# Altium footprint library THU VIEN PCB.PCBLib: 911 footprints (part 34 of 57)
Each footprint in its own frame and in the unit in brackets; x right, y up, seen from the top. Pads: shape width x height; smd on the part's side, far side on the other; paste and mask are expansions set on the pad; w line width, h text height; cw(c..) or ccw(c..) is an arc to the next point about the centre after c.
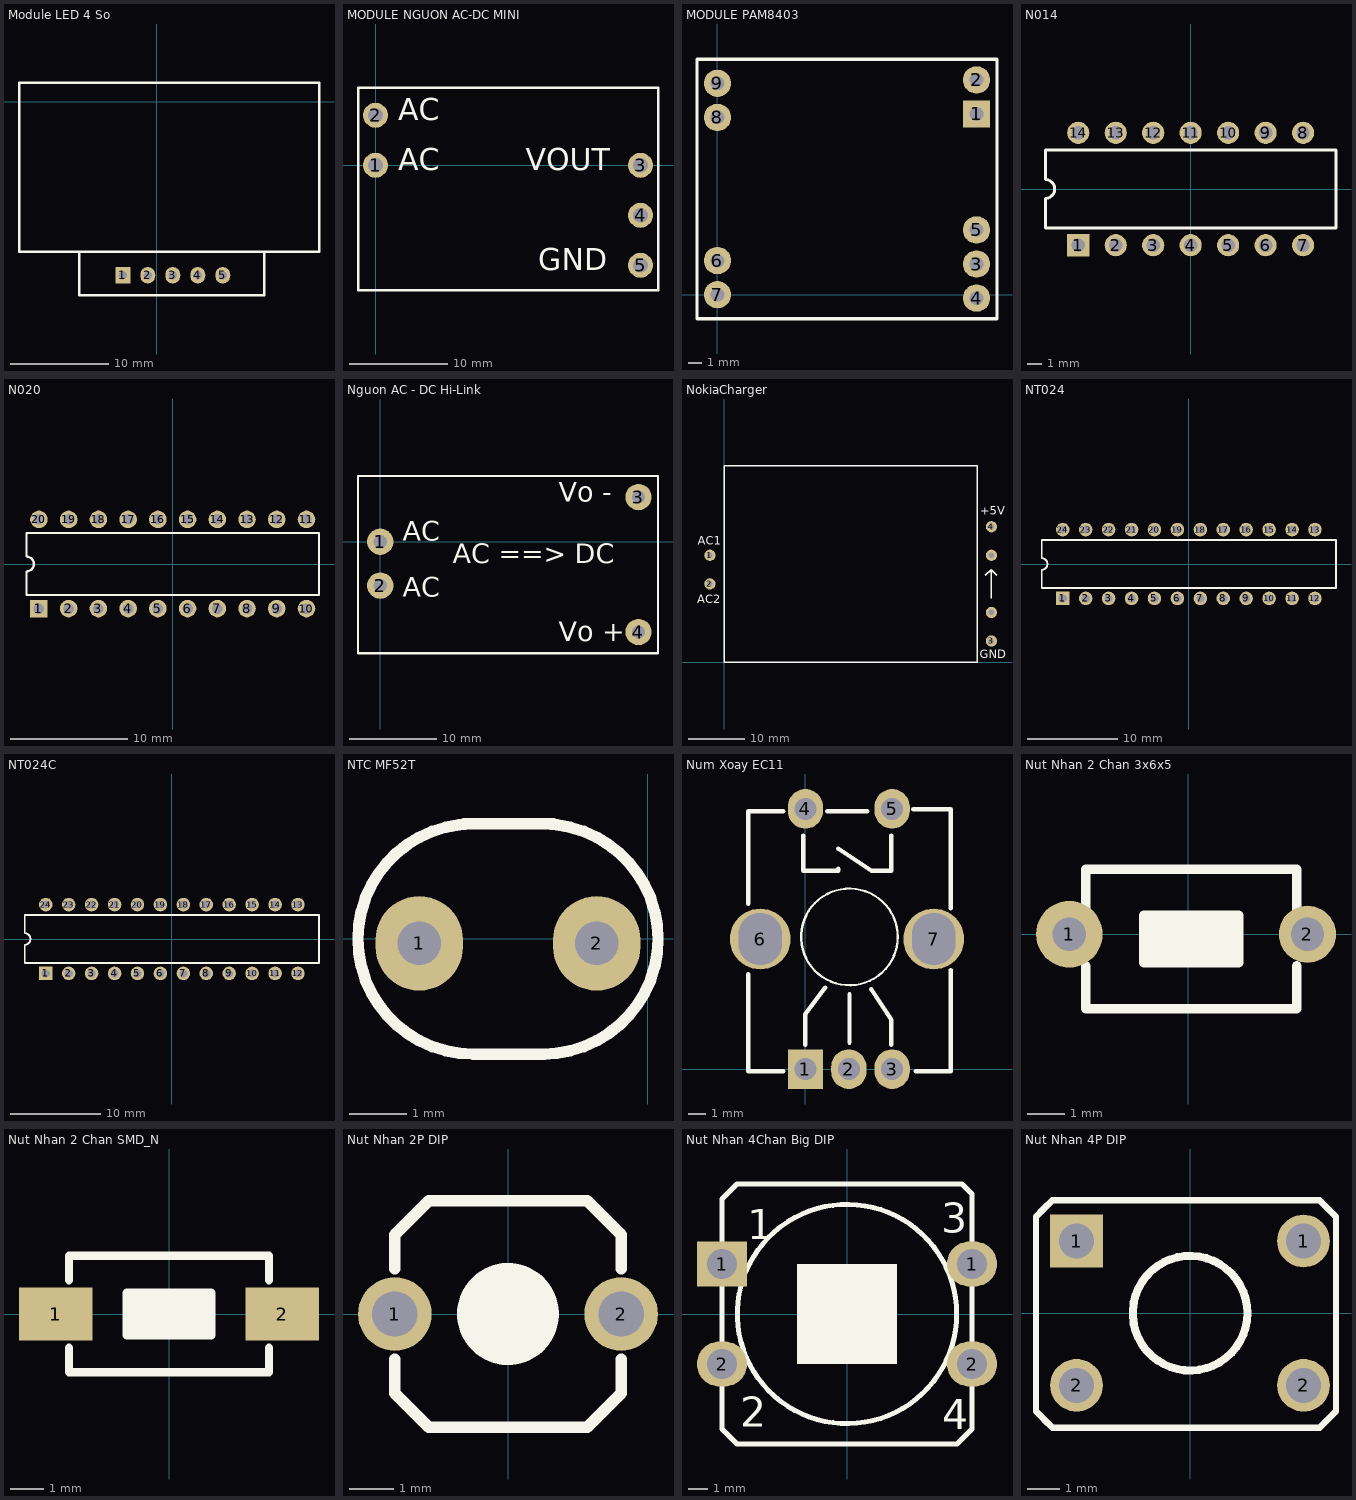
[diagram p33: the footprints below, top view; thin cyan lines are the x and y axes]

## Module LED 4 So [mil]
pads (5):
  rect 60x65 hole 35.43: 1(-135,-695)
  oval 60x65 hole 35.43: 2(-35,-695) 3(65,-695) 4(165,-695) 5(265,-695)
Top Overlay:
  lines w10: -310,-600 -310,-775 430,-775 430,-600 ; -550,-600 -550,75 650,75 650,-600 -550,-600
3D body "MH.stp": height 348.43, standoff 92.52, extent -559.67,-778.68 641.12,87.47
3D body: height 275.59, standoff -39.37, extent -151,-711 -119.63,-679.57
3D body: height 275.59, standoff -39.37, extent -51,-711 -19.63,-679.57
3D body: height 275.59, standoff -39.37, extent 49,-711 80.37,-679.57
3D body: height 275.59, standoff -39.37, extent 149,-711 180.37,-679.57
3D body: height 275.59, standoff -39.37, extent 259,-711 290.37,-679.57

## MODULE NGUON AC-DC MINI [mm]
pads (5):
  round 2.54 hole 1.5: 1(0,0) 2(0,5.08) 3(26.924,0) 4(26.924,-5.08) 5(26.924,-10.16)
Top Overlay:
  lines w0.254: -1.778,-12.7 -1.778,7.874 28.702,7.874 28.702,-12.7 -1.778,-12.7
  text "AC" at 2.286,3.81 h3.81
  text "AC" at 2.286,-1.27 h3.81
  text "GND" at 16.51,-11.43 h3.81
  text "VOUT" at 15.24,-1.27 h3.81

## MODULE PAM8403 [mm]
pads (9):
  rect 2x2 hole 1: 1(19,13.246)
  round 2 hole 1: 2(19,15.746) 3(19,2.246) 4(19,-0.254) 5(19,4.746) 6(0,2.496) 7(0,-0.004) 8(0,12.996) 9(0,15.496)
Top Overlay:
  lines w0.254: -1.5,-1.754 20.5,-1.754 20.5,17.246 -1.5,17.246 -1.5,-1.754

## N014 [mm] "DIP; 14 Leads; Row Spacing 7.62 mm; Pitch 2.54 mm"
height 5.08
pads (14):
  rect 1.5x1.5 hole 0.9: 1(-7.62,-3.81)
  round 1.5 hole 0.9: 2(-5.08,-3.81) 3(-2.54,-3.81) 4(0,-3.81) 5(2.54,-3.81) 6(5.08,-3.81) 7(7.62,-3.81) 8(7.62,3.81) 9(5.08,3.81) 10(2.54,3.81) 11(0,3.81) 12(-2.54,3.81) 13(-5.08,3.81) 14(-7.62,3.81)
Top Overlay:
  lines w0.2: -9.85,-2.65 -9.85,-0.635 ccw(c-9.85,0) -9.85,0.635 -9.85,2.65 9.85,2.65 9.85,-2.65 -9.85,-2.65

## N020 [mm] "DIP; 20 Leads; Row Spacing 7.62 mm; Pitch 2.54 mm"
height 5.08
pads (20):
  rect 1.5x1.5 hole 0.9: 1(-11.43,-3.81)
  round 1.5 hole 0.9: 2(-8.89,-3.81) 3(-6.35,-3.81) 4(-3.81,-3.81) 5(-1.27,-3.81) 6(1.27,-3.81) 7(3.81,-3.81) 8(6.35,-3.81) 9(8.89,-3.81) 10(11.43,-3.81) 11(11.43,3.81) 12(8.89,3.81) 13(6.35,3.81) 14(3.81,3.81) 15(1.27,3.81) 16(-1.27,3.81) 17(-3.81,3.81) 18(-6.35,3.81) 19(-8.89,3.81) 20(-11.43,3.81)
Top Overlay:
  lines w0.2: -12.5,-2.65 -12.5,-0.635 ccw(c-12.5,0) -12.5,0.635 -12.5,2.65 12.5,2.65 12.5,-2.65 -12.5,-2.65

## Nguon AC - DC Hi-Link [mm]
pads (4):
  round 3 hole 1.5: 1(0,0) 2(0,-5) 3(29.4,5.08) 4(29.4,-10.287)
Top Overlay:
  lines w0.254: -2.54,-12.7 -2.54,7.493 31.623,7.493 31.623,-12.7 -2.54,-12.7
  text "Vo +" at 20.32,-12.065 h3.81
  text "Vo -" at 20.32,3.81 h3.81
  text "AC" at 2.54,-0.635 h3.81
  text "AC" at 2.54,-6.985 h3.81
  text "AC ==> DC" at 8.255,-3.175 h3.81

## NokiaCharger [mm]
pads (6):
  round 2 hole 1: 1(-2.54,19.05) 2(-2.54,13.97) 3(47.54,3.81) 4(47.54,24.13) TEMP(47.54,8.89) TEMP(47.54,19.05)
Top Overlay:
  lines w0.254: 46.482,15.494 47.498,16.51 ; 47.498,11.43 47.498,16.51 ; 48.514,15.494 47.498,16.51 ; 0,0 45,0 ; 0,0 45,0 ; 0,0 0,35 ; 0,35 45,35 ; 0,35 45,35 ; 45,0 45,35
  text "AC2" at -4.826,10.541 h1.52
  text "AC1" at -4.699,20.955 h1.52
  text "+5V" at 45.593,26.289 h1.52
  text "GND" at 45.466,0.762 h1.52

## NT024 [mm] "DIP; 24 Leads; Row Spacing 7.62 mm; Pitch 2.54 mm"
height 5.08
pads (24):
  rect 1.5x1.5 hole 0.9: 1(-13.97,-3.81)
  round 1.5 hole 0.9: 2(-11.43,-3.81) 3(-8.89,-3.81) 4(-6.35,-3.81) 5(-3.81,-3.81) 6(-1.27,-3.81) 7(1.27,-3.81) 8(3.81,-3.81) 9(6.35,-3.81) 10(8.89,-3.81) 11(11.43,-3.81) 12(13.97,-3.81) 13(13.97,3.81) 14(11.43,3.81) 15(8.89,3.81) 16(6.35,3.81) 17(3.81,3.81) 18(1.27,3.81) 19(-1.27,3.81) 20(-3.81,3.81) 21(-6.35,3.81) 22(-8.89,3.81) 23(-11.43,3.81) 24(-13.97,3.81)
Top Overlay:
  lines w0.2: -16.3,-2.65 16.3,-2.65 16.3,2.65 -16.3,2.65 -16.3,0.635 cw(c-16.3,0) -16.3,-0.635 -16.3,-2.65

## NT024C [mm] "DIP; 24 Leads; Row Spacing 7.62 mm; Pitch 2.54 mm"
height 5.08
pads (24):
  rect 1.5x1.5 hole 0.9: 1(-13.97,-3.81)
  round 1.5 hole 0.9: 2(-11.43,-3.81) 3(-8.89,-3.81) 4(-6.35,-3.81) 5(-3.81,-3.81) 6(-1.27,-3.81) 7(1.27,-3.81) 8(3.81,-3.81) 9(6.35,-3.81) 10(8.89,-3.81) 11(11.43,-3.81) 12(13.97,-3.81) 13(13.97,3.81) 14(11.43,3.81) 15(8.89,3.81) 16(6.35,3.81) 17(3.81,3.81) 18(1.27,3.81) 19(-1.27,3.81) 20(-3.81,3.81) 21(-6.35,3.81) 22(-8.89,3.81) 23(-11.43,3.81) 24(-13.97,3.81)
Top Overlay:
  lines w0.2: -16.3,-2.65 -16.3,-0.635 ccw(c-16.3,0) -16.3,0.635 -16.3,2.65 16.3,2.65 16.3,-2.65 -16.3,-2.65

## NTC MF52T [mil] "Capacitor, Ceramic, ThrNTC 2A"
height 196.85
pads (2):
  oval 60x65 hole 30: 1(-157,-3) 2(-35,-3)
Top Overlay:
  lines w7.87: -126,79.06 -65,79.06 ; -120,79.06 ccw(c-120,0) -120,-79.06 -71,-79.06 ; -72,-79.11 ccw(c-72,-0.06) -72,79
3D body "NTC.step": height 198.71, standoff -76.88, extent -213.99,-77.22 22.12,73.23

## Num Xoay EC11 [mm]
pads (7):
  rect 2.032x2.286 hole 1.27: 1(0,0)
  oval 2.032x2.286 hole 1.27: 2(2.5,0) 3(5,0) 4(0,15) 5(5,15)
  round 3.5 hole 2.5 slot 3 at 90 deg: 6(-2.601,7.5) 7(7.396,7.5)
Top Overlay:
  circle w0.127: c2.54,7.62 r2.785
  lines w0.254: -3.302,5.461 -3.302,-0.127 -1.27,-0.127 ; -3.302,9.525 -3.302,14.859 -1.27,14.859 ; -0.127,13.462 -0.127,11.43 1.905,11.43 1.905,11.557 ; 0,1.397 0,3.175 1.143,4.699 ; 1.27,14.859 3.556,14.859 ; 1.905,12.7 3.81,11.43 4.953,11.43 4.953,13.462 ; 2.54,1.524 2.54,4.318 ; 3.79,4.601 4.953,2.857 4.953,1.397 ; 6.223,14.986 8.255,14.986 8.382,14.986 8.382,9.271 ; 6.35,-0.127 8.382,-0.127 8.382,5.715
3D body "EC11E-05SW.step": height 24.5, standoff -3.65, extent -3.316,-0.105 8.396,14.845

## Nut Nhan 2 Chan 3x6x5 [mil]
pads (2):
  round 70 hole 35: 1(-125,0)
  round 60 hole 35: 2(125,0)
Top Overlay:
  rectangle: -47,-30 53,20
  lines w10: -108,-33 -108,-78 114,-78 114,-33 ; -108,23 -108,68 114,68 114,23 ; -47,-30 53,-30 53,20 -47,20 -47,-30
3D body "User Library-Button-SMD.step": height 98.43, standoff 0, extent -117.07,-77.83 123.09,67.84

## Nut Nhan 2 Chan SMD_N [mm] "Switch SMD type"
pads (2):
  rect 2.2x1.6 smd: 1(-3.4,0) 2(3.4,0)
Top Overlay:
  rectangle: -1.27,-0.635 1.27,0.635
  lines w0.254: -3,-1.016 -3,-1.75 3,-1.75 3,-1.016 ; -3,1.016 -3,1.75 3,1.75 3,1.016 ; -1.27,-0.635 -1.27,0.635 1.27,0.635 1.27,-0.635 -1.27,-0.635
3D body "User Library-Button-SMD.step": height 2.5, standoff 0, extent -3.05,-1.85 3.05,1.85

## Nut Nhan 2P DIP [mil] "Button 200mil 2 Pin"
pads (2):
  round 65 hole 40: 1(-100,0) 2(100,0)
Top Overlay:
  circle w50: c0,0 r20
  lines w10: -100,-40 -100,-70 -70,-100 70,-100 100,-70 100,-40 ; -100,40 -100,70 -70,100 70,100 100,70 100,40

## Nut Nhan 4Chan Big DIP [mil] "Nut an to"
pads (4):
  rect 100x90 hole 60: 1(-250,100)
  oval 100x90 hole 60: 1(250,100) 2(-250,-100) 2(250,-100)
Top Overlay:
  circle w10: c0,0 r219.32
  rectangle: -100,-100 100,100
  lines w10: -250,-140 -250,-230 -220,-260 220,-260 250,-230 250,-140 ; -250,-60 -250,60 ; -250,140 -250,230 -220,260 230,260 250,240 250,140 ; 250,-60 250,60
  text "4" at 190,-230 h60
  text "3" at 188,163 h60
  text "2" at -214,-225 h60
  text "1" at -200,150 h60
3D body "bu12x12.stp": height 514.38, standoff 0.6, extent -239.73,-237.14 232.72,235.3

## Nut Nhan 4P DIP [mil] "BUTTON SMORE 280mil x 178mil"
height 100
pads (4):
  rect 65x65 hole 43.31: 1(-140,89)
  round 65 hole 43.31: 1(140,89) 2(-140,-89) 2(140,-89)
Top Overlay:
  circle w10: c0,0 r70.71
  lines w8: -180,-131 -170,-141 ; -170,-141 -190,-121 -190,119 -180,129 -170,139 -160,139 160,139 180,119 180,-121 160,-141 -170,-141
3D body "SW3dPS-.STEP": height 275.59, standoff -137.8, extent -158.51,-124.04 152.51,120.05